# Altium footprint library Cty1.PcbLib: 869 footprints (part 42 of 55)
Each footprint in its own frame and in the unit in brackets; x right, y up, seen from the top. Pads: shape width x height; smd on the part's side, far side on the other; paste and mask are expansions set on the pad; w line width, h text height; cw(c..) or ccw(c..) is an arc to the next point about the centre after c.
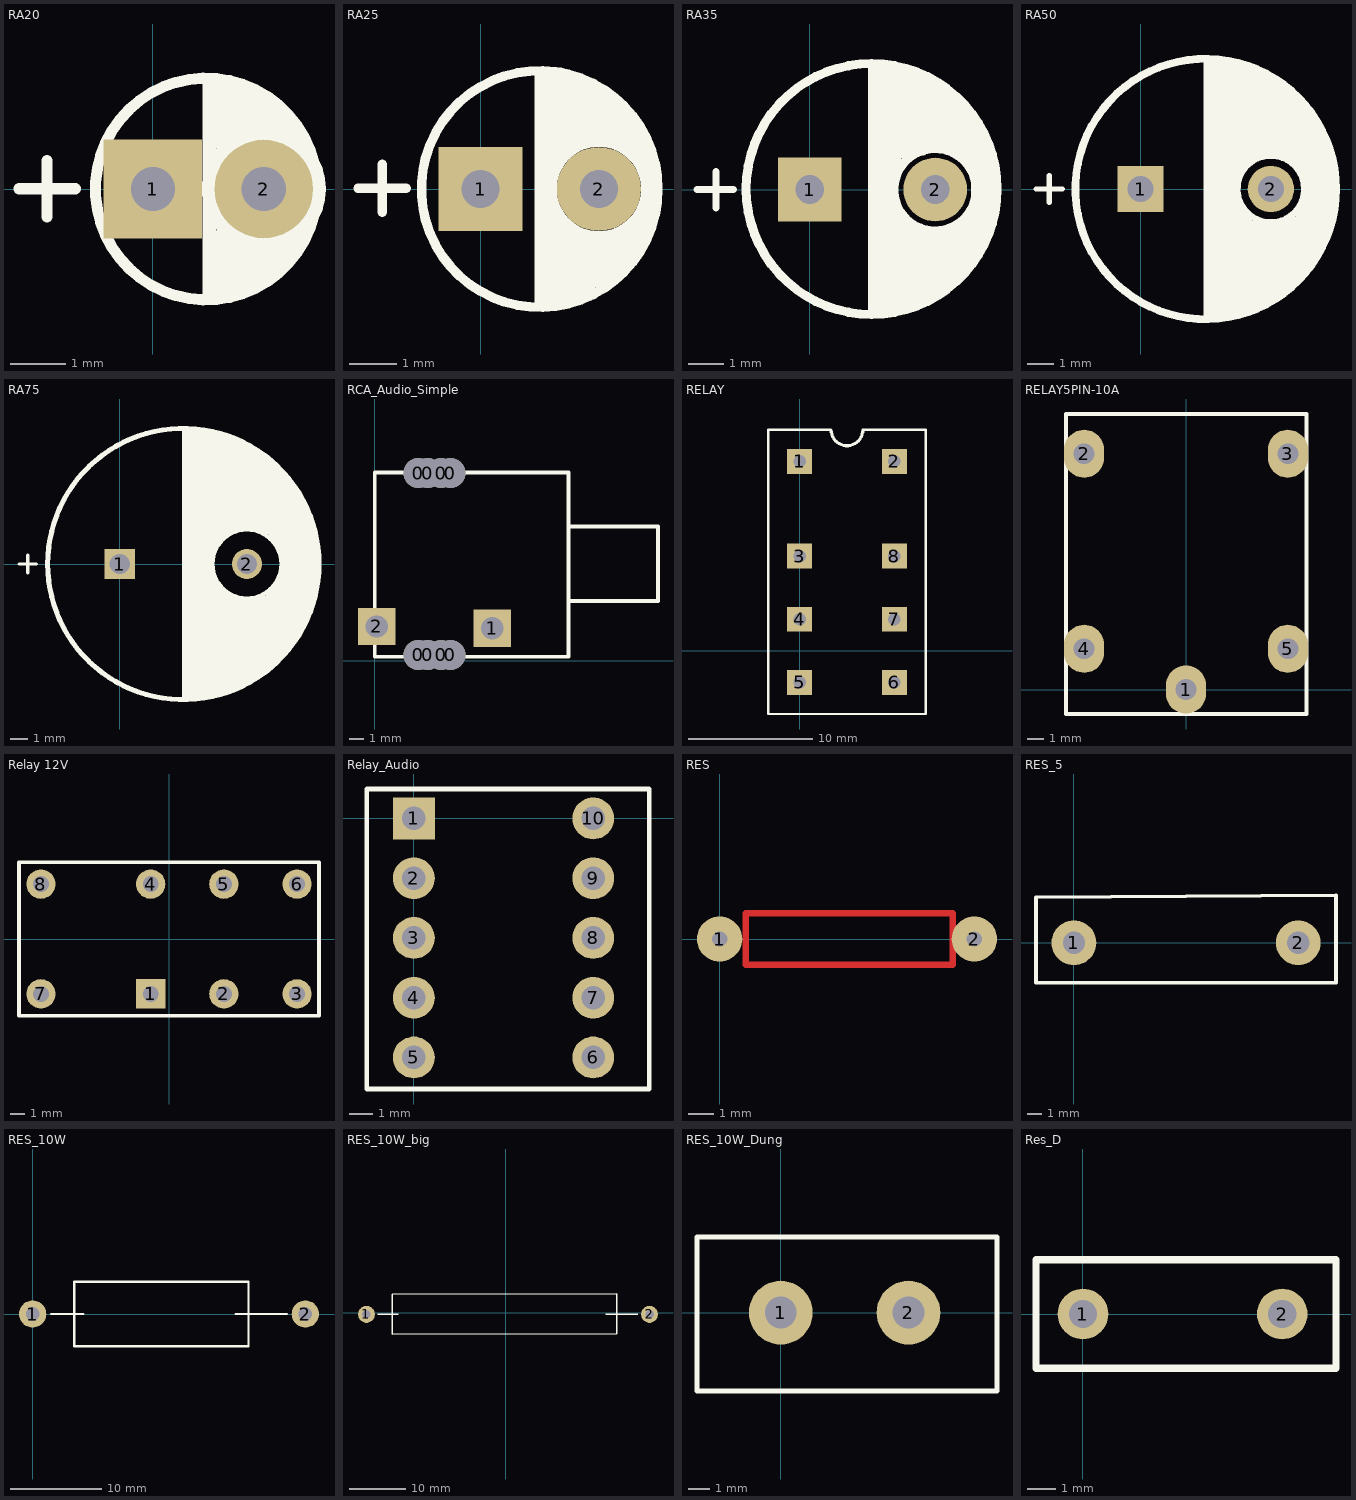
[diagram p41: the footprints below, top view; thin cyan lines are the x and y axes]

## RA20 [mil]
pads (2):
  rect 70x70 hole 31.5 unplated: 1(0,0)
  round 70 hole 31.5 unplated: 2(78.74,0)
Top Overlay:
  circle w10: c78.74,0 r39.24
  circle w7.87: c37.86,0 r78.74
  lines w7.87: -95.2,0.2 -55.2,0.2 ; -75.2,-19.8 -75.2,20.2
  lines w10: 88.6,-56.4 88.6,-44 ; 95.4,-48.2 95.4,-44 88.6,-44 ; 100,46.4 100,38.6 90.8,38.6 90.8,55.8 85.6,55.8 85.6,44.2 78.2,44.2 78.2,64.6 71,64.6 71,39.4 63,39.4 63,71.8 55,71.8 55,33.2 48,33.2 48,76.4 40.2,76.4 40.2,-73.6 49.2,-73.6 49.2,-32.6 55.6,-32.6 55.6,-70.2 64.4,-70.2 64.4,-41.8 72.4,-41.8 72.4,-64.8 80.4,-64.8 80.4,-44 88.6,-44 ; 101.2,-36.4 101.2,-44 97.2,-44 88.6,-44

## RA25 [mil]
pads (2):
  rect 70x70 hole 31.5 unplated: 1(0,0)
  round 70 hole 31.5 unplated: 2(98.42,0)
Top Overlay:
  circle w7.87: c49.21,0 r98.43
  circle w10: c98.43,0 r40.03
  lines w7.87: -101.96,0.6 -61.96,0.6 ; -81.96,-19.4 -81.96,20.6
  lines w10: 49.8,96 49.8,-96 58.6,-96 58.6,96 66.4,96 66.4,32.6 ; 58.6,-26 66.2,-26 66.2,-92.8 75.4,-92.8 75.4,-38.6 83.4,-38.6 83.4,-88.2 90.4,-88.2 90.4,-44.6 99.6,-44.6 99.6,-79.6 105,-79.6 105,-42.2 112.8,-42.2 112.8,-69.6 ; 66.4,88.8 74.8,88.8 74.8,37.6 82.2,37.6 82.2,87.8 90.2,87.8 90.2,43 98.8,43 98.8,80.2 103.2,80.2 103.2,44.2 111.4,44.2 111.4,71.4 114.6,71.4 114.6,38.2 122.2,38.2 122.2,60.4 125,60.4 125,30.6 130.6,30.6 130.6,48.4 ; 118.2,-35.6 121.8,-35.6 121.8,-63.2 ; 128.8,-27.6 130,-27.6 130,-50.8 ; 136.8,-18.2 138.6,-18.2 ; 136.8,20.4 138.8,20.4 ; 138.46,0 138.46,-18.2 138.6,-18.2 ; 138.6,-35.6 138.6,-18.2 ; 138.8,36.6 138.8,20.4 ; 140,-5.4 140,20.4 138.8,20.4

## RA35 [mil]
pads (2):
  rect 70x70 hole 31.5 unplated: 1(0,0)
  round 70 hole 31.5 unplated: 2(137.8,0)
Top Overlay:
  circle w10: c137.48,-0.2 r45.32
  circle w10: c67.8,0.6 r137.8
  lines w7.87: -124,0 -84,0 ; -103.15,-20 -103.15,20
  lines w10: 68.8,136.8 68.8,-133.4 78.4,-133.4 78.4,134.2 87.4,134.2 87.4,-133 94.6,-133 94.6,-26.8 100.8,-26.8 100.8,-129 109,-129 109,-43.4 116.2,-43.4 116.2,-124.2 124,-124.2 124,-48.8 131.6,-48.8 ; 95.4,21.4 95.4,135.2 ; 95.4,128.6 103.8,128.6 103.8,38 110.2,38 110.2,127.2 117.6,127.2 117.6,42.4 124.2,42.4 124.2,124 ; 131.6,-118.4 131.6,-48.8 ; 133.2,45.8 130.2,45.8 130.2,117.8 136,117.8 136,46.4 143,46.4 143,111.4 147,111.4 147,47.2 154.8,47.2 154.8,102.6 157.4,102.6 157.4,43 164.8,43 164.8,95.8 164.8,36.8 174.4,36.8 174.4,85.4 ; 139,-49.2 147,-49.2 147,-106.6 153.2,-106.6 153.2,-46.6 159.8,-46.6 159.8,-98.6 ; 140.4,-112.8 140.4,-48.8 131.6,-48.8 ; 162,-38.6 167,-38.6 ; 167,-87.4 167,-38.6 ; 174,-30.6 174,-38.6 175.6,-38.6 ; 174.4,31 182.2,31 ; 175.6,-80 175.6,-38.6 ; 175.6,-69 182.2,-69 182.2,69.8 185,69.8 185,-56.2 190.8,-56.2 190.8,51.4 193.8,51.4 193.8,-37.2 198.6,-37.2 198.6,29.4 ; 167,-38.6 175.6,-38.6

## RA50 [mil]
pads (2):
  rect 70x70 hole 39.37 unplated: 1(0,0)
  round 70 hole 39.37 unplated: 2(196.85,0)
Top Overlay:
  circle w11.81: c98.43,0 r196.85
  rectangle: 110,-192 148,192
  rectangle: 142,50 272,88
  rectangle: 144,-90 270,-48
  rectangle: 144,-186 172,-90
  rectangle: 172,-176 190,-90
  rectangle: 190,-168 206,-90
  rectangle: 206,-160 218,-90
  rectangle: 218,-152 230,-90
  rectangle: 230,-140 238,-90
  rectangle: 238,-132 246,-90
  rectangle: 246,-122 254,-90
  rectangle: 254,-112 262,-90
  rectangle: 262,-102 270,-90
  rectangle: 247.53,-50 290,54
  rectangle: 142,88 268,100
  rectangle: 142,100 262,108
  rectangle: 142,108 256,118
  rectangle: 142,118 250,128
  rectangle: 142,128 240,138
  rectangle: 142,138 230,148
  rectangle: 142,148 220,156
  rectangle: 142,156 160,184
  rectangle: 160,156 174,182
  rectangle: 174,156 184,178
  rectangle: 184,156 196,172
  rectangle: 196,156 210,164
  rectangle: 272,50 282,78
  rectangle: 270,-88 278,-48
  rectangle: 278,-68 286,-48
  rectangle: 224,-50 247.53,-42
  rectangle: 234,-42 247.53,-38
  rectangle: 244,-38 247.53,-22
  rectangle: 236,-38 244,-28
  rectangle: 142,42 174,50
  rectangle: 144,34 164,44
  rectangle: 144,26 154,34
  rectangle: 220,44 250,52
  rectangle: 242,22 250,44
  rectangle: 230,38 242,44
  rectangle: 238,30 242,38
  rectangle: 144,-48 168,-42
  rectangle: 144,-42 154,-26
  rectangle: 154,-42 162,-34
  lines w7.87: -158,0 -118,0 ; -138,-20 -138,20
  lines w10: 100,194 100,-196 108,-196 108,190 ; 247.5,-1.71 cw(c196.85,0) 247.53,0

## RA75 [mil]
pads (2):
  rect 70x70 hole 47.24 unplated: 1(0,0)
  round 70 hole 47.24 unplated: 2(295.28,0)
Top Overlay:
  circle w10: c295.28,0 r80.14
  circle w11.81: c147.64,0 r314.96
  rectangle: 198,302 208,312
  rectangle: 232,294 244,300
  rectangle: 224,294 232,306
  rectangle: 190,296 224,306
  rectangle: 150,294 198,312
  rectangle: 150,290 258,296
  rectangle: 150,290 258,294
  rectangle: 150,286 270,290
  rectangle: 150,280 282,286
  rectangle: 362,216 370,226
  rectangle: 352,216 362,232
  rectangle: 340,216 352,244
  rectangle: 326,216 340,252
  rectangle: 316,216 326,262
  rectangle: 304,216 316,270
  rectangle: 294,216 304,274
  rectangle: 396,182 400,190
  rectangle: 388,182 396,198
  rectangle: 384,182 388,204
  rectangle: 376,182 384,212
  rectangle: 376,174 404,182
  rectangle: 446,76 450,90
  rectangle: 442,76 446,100
  rectangle: 438,76 442,114
  rectangle: 432,76 438,126
  rectangle: 428,76 432,134
  rectangle: 422,76 428,146
  rectangle: 418,76 422,154
  rectangle: 412,76 418,164
  rectangle: 454,-24 460,24
  rectangle: 448,-56 458,66
  rectangle: 448,-80 454,76
  rectangle: 442,-102 448,76
  rectangle: 434,-122 440,-110
  rectangle: 412,-150 428,-122
  rectangle: 398,-174 414,-150
  rectangle: 408,-166 418,-154
  rectangle: 386,-198 396,-188
  rectangle: 386,-188 402,-178
  rectangle: 366,-220 376,-212
  rectangle: 366,-212 384,-204
  rectangle: 290,-274 308,-264
  rectangle: 300,-270 314,-264
  rectangle: 300,-264 320,-260
  rectangle: 300,-260 328,-254
  rectangle: 300,-254 338,-246
  rectangle: 300,-246 344,-242
  rectangle: 300,-242 354,-234
  rectangle: 300,-234 358,-228
  rectangle: 150,-312 194,-308
  rectangle: 150,-308 222,-304
  rectangle: 150,-304 232,-300
  rectangle: 150,-300 244,-296
  rectangle: 150,-296 258,-292
  rectangle: 150,-292 266,-288
  rectangle: 150,-288 276,-282
  rectangle: 150,-284 288,-276
  rectangle: 372,20 378,32
  rectangle: 370,32 378,40
  rectangle: 364,40 378,50
  rectangle: 358,50 378,58
  rectangle: 354,58 378,62
  rectangle: 346,62 378,68
  rectangle: 340,68 378,72
  rectangle: 332,72 378,76
  rectangle: 238,62 254,78
  rectangle: 246,70 258,78
  rectangle: 238,62 246,78
  rectangle: 230,52 238,78
  rectangle: 224,46 230,78
  rectangle: 220,38 224,78
  rectangle: 216,30 220,78
  rectangle: 250,-80 262,-70
  rectangle: 244,-80 250,-66
  rectangle: 236,-80 244,-60
  rectangle: 230,-80 236,-54
  rectangle: 224,-80 230,-46
  rectangle: 202,-80 224,-32
  rectangle: 374,-30 378,-20
  rectangle: 370,-40 378,-30
  rectangle: 362,-52 378,-40
  rectangle: 352,-64 358,-58
  rectangle: 344,-70 358,-64
  rectangle: 338,-74 358,-70
  rectangle: 330,-78 358,-74
  rectangle: 358,-78 378,-52
  rectangle: 420,-134 434,-110
  rectangle: 408,-154 420,-110
  rectangle: 386,-178 408,-110
  rectangle: 366,-204 388,-78
  rectangle: 376,76 412,174
  rectangle: 150,-80 216,78
  rectangle: 150,-278 300,-228
  rectangle: 150,216 294,280
  rectangle: 378,-110 442,76
  rectangle: 150,76 378,216
  rectangle: 150,-228 366,-78
  lines w7.87: -233.94,0 -193.94,0 ; -213.94,-20 -213.94,20
  lines w10: 150,-314 150,312

## RCA_Audio_Simple [mm] "Connecter Audio"
pads (10):
  round 2 hole 2: 0(2.921,0.381) 0(2.921,12.573) 0(3.556,0.381) 0(3.556,12.573) 0(4.445,0.381) 0(4.445,12.573) 0(5.08,0.381) 0(5.08,12.573)
  rect 2.5x2.5 hole 1.5: 1(7.874,2.159) 2(0.127,2.286)
Top Overlay:
  lines w0.254: 13,4 19,4 19,9 13,9 ; 0,0.254 0,12.619 13,12.619 13,0.254 0,0.254

## RELAY [mm]
pads (8):
  rect 2x2 hole 1: 1(0,15.24) 2(7.62,15.24) 3(0,7.62) 4(0,2.54) 5(0,-2.54) 6(7.62,-2.54) 7(7.62,2.54) 8(7.62,7.62)
Top Overlay:
  lines w0.2: 2.413,17.78 -2.54,17.78 -2.54,-5.08 10.16,-5.08 10.16,17.78 5.08,17.78
  lines w0.254: 2.534,17.78 ccw(c3.81,17.78) 5.086,17.78
3D body "SW3dPS-DSY2Y.STEP": height 12.3, standoff -3, extent -1.09,-4.05 8.71,16.75

## RELAY5PIN-10A [mm]
pads (5):
  oval 2.5x3 hole 1.3: 1(0,0) 2(-6.35,14.7) 3(6.35,14.7) 4(-6.35,2.54) 5(6.35,2.54)
Top Overlay:
  lines w0.254: -7.493,-1.524 -7.493,17.176 7.507,17.176 7.507,-1.524 -7.493,-1.524
3D body: height 16, standoff 0, extent -7.493,-1.524 7.493,17.145

## Relay 12V [mil] "RELAY"
pads (8):
  rect 80x80 hole 43.31: 1(-50,-150)
  round 80 hole 43.31: 2(150,-150) 3(350,-150) 4(-50,150) 5(150,150) 6(350,150) 7(-350,-150) 8(-350,150)
Top Overlay:
  lines w10: -410,-210 -410,210 410,210 410,-210 -410,-210

## Relay_Audio [mil]
pads (10):
  rect 70x70 hole 39.37 unplated: 1(0,0)
  round 70 hole 39.37 unplated: 2(0,-100) 3(0,-200) 4(0,-300) 5(0,-400) 6(300,-400) 7(300,-300) 8(300,-200) 9(300,-100) 10(300,0)
Top Overlay:
  lines w7.87: -78.74,47.24 -78.74,-452.76 393.7,-452.76 393.7,47.24 ; -78.74,49.21 393.7,49.21

## RES [mil]
pads (2):
  round 70 hole 23.62 unplated: 1(0,0) 2(393.7,0)
Top Layer:
  lines w10: 40,-40 360,-40 360,40 40,40 40,-40

## RES_5 [mm]
pads (2):
  round 3 hole 1.5 unplated: 1(0,0) 2(15,0)
Top Overlay:
  lines w0.254: -2.54,-2.667 -2.54,3.048 17.526,3.175 17.526,-2.667 -2.54,-2.667

## RES_10W [mm]
pads (2):
  round 3 hole 1.5 unplated: 1(0,0) 2(30,0)
Top Overlay:
  lines w0.254: 2.032,0 5.588,0 ; 22.352,0 27.94,0 ; 4.572,-3.556 4.572,0 4.572,3.556 23.749,3.556 23.749,-3.556 4.572,-3.556

## RES_10W_big [mm]
pads (2):
  round 3 hole 1.5 unplated: 1(-24.638,-0.254) 2(25.362,-0.254)
Top Overlay:
  lines w0.254: -22.606,-0.254 -19.05,-0.254 ; 17.653,-0.254 23.241,-0.254 ; -20.066,-3.81 -20.066,-0.254 -20.066,3.302 19.558,3.429 19.558,-3.683 -20.066,-3.81

## RES_10W_Dung [mm]
pads (2):
  round 3 hole 1.5 unplated: 1(0,0) 2(6,0)
Top Overlay:
  lines w0.254: -3.937,-3.683 -3.937,0 -3.937,3.556 10.16,3.556 10.16,-3.683 -3.937,-3.683

## Res_D [mil]
pads (2):
  round 70 hole 39.37 unplated: 1(0,0) 2(275.59,0)
Top Overlay:
  lines w10: -50,75 350,75 350,-75 -65,-75 -65,75 -35,75